# Altium footprint library PcbLib.PcbLib: 142 footprints (part 3 of 9)
Each footprint in its own frame and in the unit in brackets; x right, y up, seen from the top. Pads: shape width x height; smd on the part's side, far side on the other; paste and mask are expansions set on the pad; w line width, h text height; cw(c..) or ccw(c..) is an arc to the next point about the centre after c.
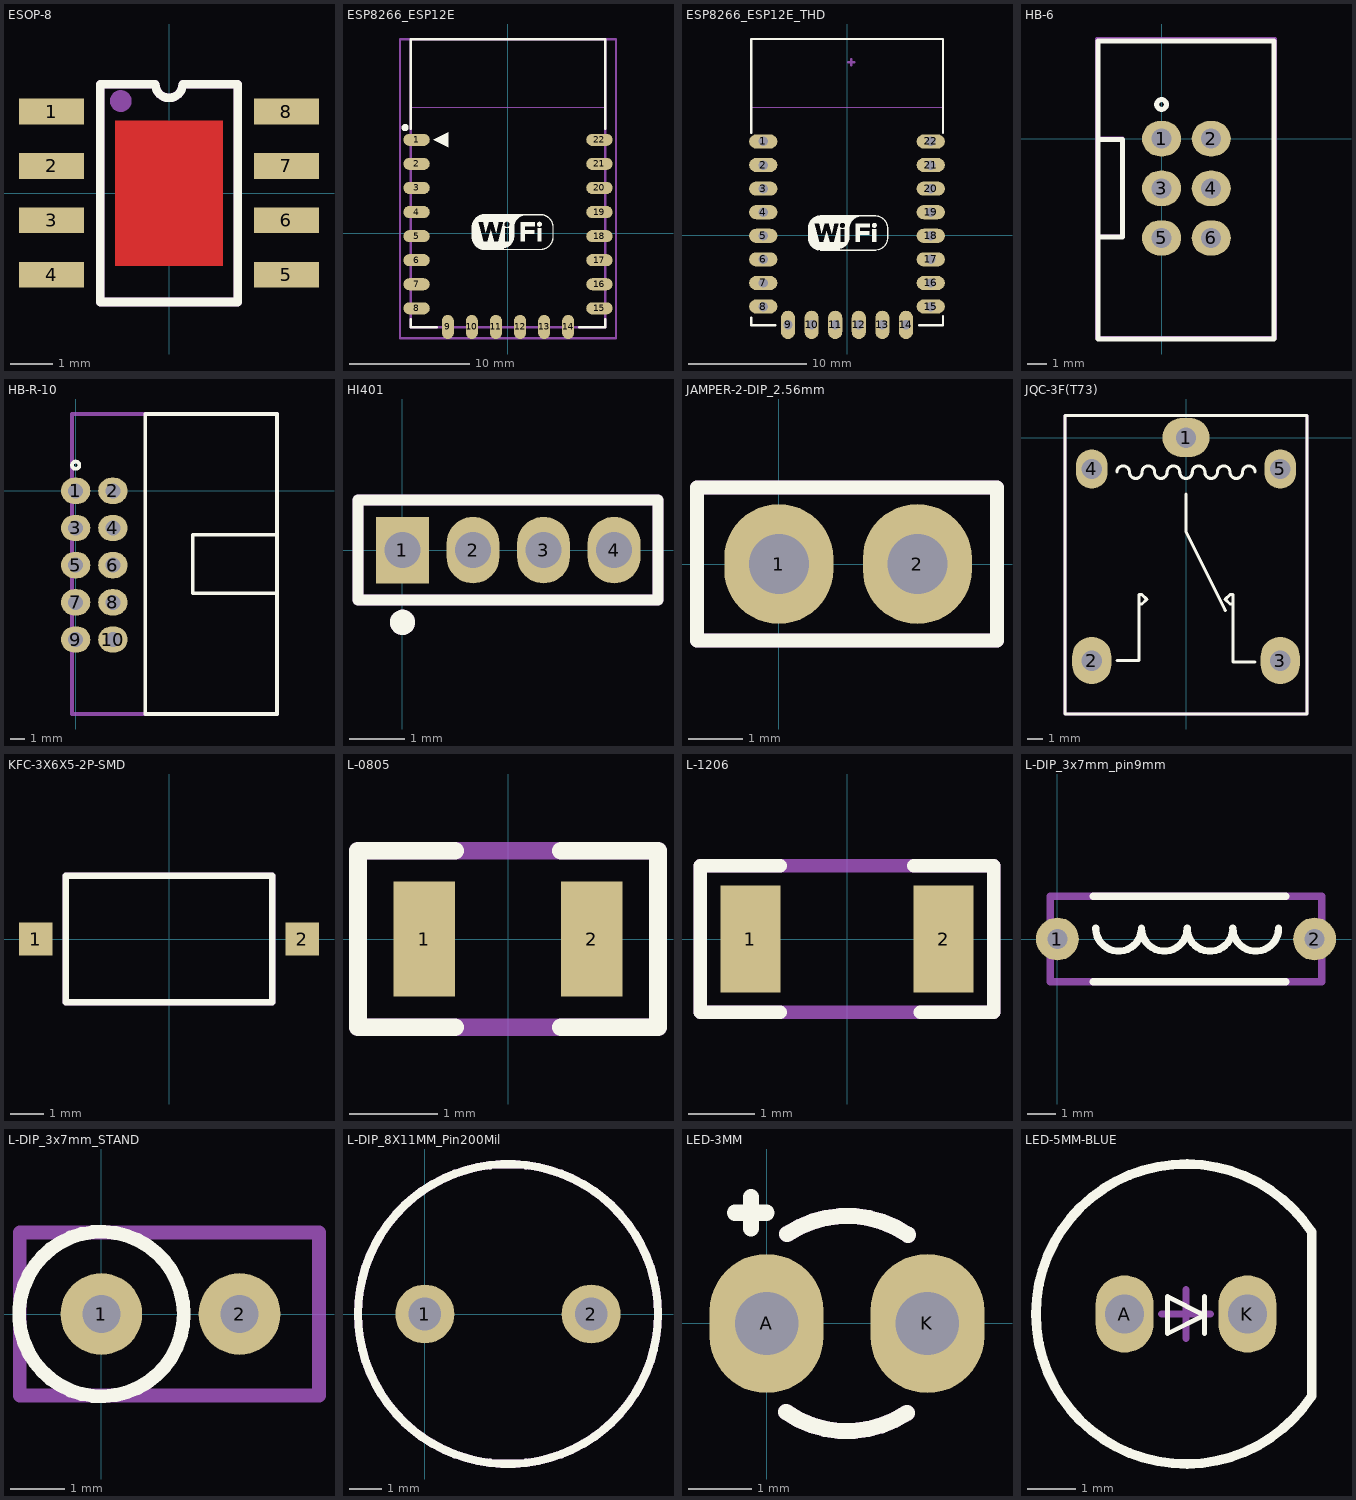
[diagram p2: the footprints below, top view; thin cyan lines are the x and y axes]

## ESOP-8 [mm]
pads (8):
  rect 1.52x0.6 smd: 1(-2.74,1.905) 2(-2.74,0.635) 3(-2.74,-0.635) 4(-2.74,-1.905) 5(2.74,-1.905) 6(2.74,-0.635) 7(2.74,0.635) 8(2.74,1.905)
Top Layer:
  rectangle: -1.256,-1.701 1.256,1.701
Top Overlay:
  lines w0.2: -1.6,-2.54 1.6,-2.54 1.6,2.54 0.318,2.54 cw(c0,2.54) -0.318,2.54 -1.6,2.54 -1.6,-2.54
Top Paste:
  rectangle: -1.256,-1.701 1.256,1.701
Top Solder:
  rectangle: -1.4,-1.85 1.4,1.85
Mechanical 29:
  circle w0.254: c-1.125,2.15 r0.127
  lines w0.2: -1.6,-2.54 1.6,-2.54 1.6,2.54 0.318,2.54 cw(c0,2.542) -0.317,2.54 -1.6,2.54 -1.6,-2.54
  text ".Designator" at 0.238,-1.121 h1
3D body "SOP8.step": height 1.75, standoff 0, extent -3.1,-2.5 3.1,2.5

## ESP8266_ESP12E [mm] "ESP-12 Wi-Fi Module"
height 3.2
pads (22):
  oval 2.2x1 smd: 1(-7.6,7.75) 2(-7.6,5.75) 3(-7.6,3.75) 4(-7.6,1.75) 5(-7.6,-0.25) 6(-7.6,-2.25) 7(-7.6,-4.25) 8(-7.6,-6.25) 15(7.6,-6.25) 16(7.6,-4.25) 17(7.6,-2.25) 18(7.6,-0.25) 19(7.6,1.75) 20(7.6,3.75) 21(7.6,5.75) 22(7.6,7.75)
  oval 1x2 smd: 9(-5,-7.8) 10(-3,-7.8) 11(-1,-7.8) 12(1,-7.8) 13(3,-7.8) 14(5,-7.8)
Top Overlay:
  drawing of 13 lines, arcs and shapes, not listed
Mechanical 29:
  lines w0.2: -8.975,-8.75 8.975,-8.75 8.975,16.121 -8.975,16.121 -8.975,-8.75
  text ".Designator" at -2.086,2.057 h1
Mechanical 13:
  lines w0.051: -8.127,10.477 8.129,10.477 8.129,16.132 -8.127,16.132 -8.127,10.477
  lines w0.2: -8.084,-7.818 -8.084,16.121 8.084,16.121 8.084,-7.818 -8.084,-7.818
3D body "ESP_12_E.STEP": height 2.75, standoff 0.04, extent -7.999,-7.741 8.001,16.259

## ESP8266_ESP12E_THD [mm] "ESP8266 ESP-12-E YHD"
pads (22):
  oval 2.4x1.2 hole 0.8: 1(-7.1,7.95) 2(-7.1,5.95) 3(-7.1,3.95) 4(-7.1,1.95) 5(-7.1,-0.05) 6(-7.1,-2.05) 7(-7.1,-4.05) 8(-7.1,-6.05) 15(7.1,-6.05) 16(7.1,-4.05) 17(7.1,-2.05) 18(7.1,-0.05) 19(7.1,1.95) 20(7.1,3.95) 21(7.1,5.95) 22(7.1,7.95)
  oval 1.2x2.4 hole 0.8: 9(-5,-7.6) 10(-3,-7.6) 11(-1,-7.6) 12(1,-7.6) 13(3,-7.6) 14(5,-7.6)
Top Overlay:
  drawing of 11 lines, arcs and shapes, not listed
Mechanical 13:
  lines w0.051: -8.063,10.87 8.193,10.87
Mechanical 15:
  lines w0.2: 0.114,14.679 0.622,14.679 ; 0.368,14.425 0.368,14.933
3D body "User Library-ESP_12_E.STEP": height -0.34, standoff -2.55, extent -8.001,-7.493 7.999,16.507

## HB-6 [mm]
pads (6):
  oval 2x1.8 hole 1.02: 1(0,0) 2(2.54,0) 3(0,-2.54) 4(2.54,-2.54) 5(0,-5.08) 6(2.54,-5.08)
Top Overlay:
  circle w0.254: c0,1.75 r0.25
  lines w0.254: -3.25,-10.25 5.75,-10.25 5.75,5 -3.25,5 -3.25,-10.25 ; -3.25,-5.04 -2,-5.04 -2,-0.04 -3.25,-0.04 -3.25,-5.04
Mechanical 29:
  lines w0.2: -3.25,-5 -2,-5 -2,0 -3.25,0 ; -3.3,-10.2 -3.3,5.1 5.8,5.1 5.8,-10.2 -3.3,-10.2
  text ".Designator" at 1.467,-4.7 h1
3D body "User Library-BH-06 (IDC-06MS).STEP": height 9, standoff -3, extent -3.291,-10.15 5.809,5.07

## HB-R-10 [mm]
pads (10):
  oval 2x1.8 hole 1.02: 1(0,0) 2(2.54,0) 3(0,-2.54) 4(2.54,-2.54) 5(0,-5.08) 6(2.54,-5.08) 7(0,-7.62) 8(2.54,-7.62) 9(0,-10.16) 10(2.54,-10.16)
Top Overlay:
  circle w0.254: c0,1.75 r0.25
  lines w0.254: 13.75,-7 8,-7 8,-3 13.75,-3 ; 4.75,-15.25 4.75,5.25 13.75,5.25 13.75,-15.25 4.75,-15.25
Mechanical 29:
  lines w0.254: -0.25,-15.25 -0.25,5.25 13.75,5.25 13.75,-15.25 -0.25,-15.25
  text ".Designator" at 8.967,-8.8 h1
3D body "User Library-DS1013-10R (IDC-10R CONNFLY).step": height 9, standoff -2.9, extent -0.32,-15.33 13.7,5.17

## HI401 [mm]
pads (4):
  rect 0.95x1.2 hole 0.65: 1(0,0)
  oval 0.95x1.2 hole 0.65: 2(1.27,0) 3(2.54,0) 4(3.81,0)
Top Overlay:
  circle w0.254: c0,-1.3 r0.1
  lines w0.2: -0.8,-0.9 -0.8,0.9 4.6,0.9 4.6,-0.9 -0.8,-0.9
Mechanical 29:
  circle w0.254: c0,-1.3 r0.1
  lines w0.2: -0.8,-0.9 -0.8,0.9 4.6,0.9 4.6,-0.9 -0.8,-0.9
  text ".Designator" at 0.6,-0.467 h1
3D body "Part1-n.STEP": height 9.8, standoff -7.66, extent -0.762,-0.763 4.578,0.787

## JAMPER-2-DIP_2.56mm [mm]
pads (2):
  oval 2x2.2 hole 1.1 mask+0.102: 1(0,0) 2(2.54,0)
Top Overlay:
  lines w0.254: -1.5,-1.4 -1.5,-0.7 -1.5,0.7 -1.5,1.4 4,1.4 4,-1.4 -1.5,-1.4
Mechanical 29:
  lines w0.254: -1.5,-1.4 -1.5,-0.7 -1.5,0.7 -1.5,1.4 4,1.4 4,-1.4 -1.5,-1.4
  text ".Designator" at 0.1,-0.467 h1
3D body "Jumper2.step": height 8.7, standoff -2.9, extent -1.33,-1.27 3.87,1.27

## JQC-3F(T73) [mm]
pads (5):
  oval 3x2.5 hole 1.3 paste-2539.97 mask+0.04: 1(0,0)
  oval 2.5x3 hole 1.3 paste-2539.97 mask+0.04: 2(-6,-14.2) 3(6,-14.2)
  oval 2x2.5 hole 1.3 paste-2539.97 mask+0.04: 4(-6,-2) 5(6,-2)
Top Overlay:
  lines w0.2: -4.4,-14.2 -3,-14.2 -3,-10 -2.8,-10 -2.5,-10.3 -2.8,-10.6 -3,-10.6 ; -4.4,-2.2 cw(c-4,-2.2) -3.6,-2.2 ccw(c-3.2,-2.2) -2.8,-2.2 cw(c-2.4,-2.2) -2,-2.2 ccw(c-1.6,-2.2) -1.2,-2.2 cw(c-0.8,-2.2) -0.4,-2.2 ccw(c0,-2.2) 0.4,-2.2 cw(c0.8,-2.2) 1.2,-2.2 ccw(c1.6,-2.2) 2,-2.2 cw(c2.4,-2.2) 2.8,-2.2 ccw(c3.2,-2.2) 3.6,-2.2 cw(c4,-2.2) 4.4,-2.2 ; 0,-3.6 0,-6 2.5,-11 ; 3,-10.6 2.8,-10.6 2.5,-10.3 2.8,-10 3,-10 3,-12 3,-14.3 4.4,-14.3 ; -7.7,-17.6 7.7,-17.6 7.7,1.4 -7.7,1.4 -7.7,-17.6
Mechanical 29:
  lines w0.2: -7.7,-17.6 7.7,-17.6 7.7,1.4 -7.7,1.4 -7.7,-17.6
  text ".Designator" at -2.8,-8.467 h1
3D body "Relay - JQC-3F(T73) - 5V.stp": height 14.94, standoff -3.61, extent -7.544,-17.447 7.544,1.247

## KFC-3X6X5-2P-SMD [mm]
pads (2):
  rect 1x1 smd: 1(-4,0) 2(4,0)
Top Overlay:
  lines w0.2: -3.1,-1.9 -3.1,1.9 3.1,1.9 3.1,-1.9 -3.1,-1.9
Mechanical 29:
  lines w0.2: -3.1,-1.9 -3.1,1.9 3.1,1.9 3.1,-1.9 -3.1,-1.9
  text ".Designator" at -0.8,-0.467 h1
3D body "btn.STEP": height 5, standoff 0, extent -4.5,-1.775 4.5,1.775

## L-0805 [mm]
pads (2):
  rect 0.7x1.3 smd: 1(-0.95,0) 2(0.95,0)
Top Overlay:
  lines w0.2: -0.6,-1 -1.7,-1 -1.7,1 -0.6,1 ; 0.6,-1 1.7,-1 1.7,1 0.6,1
Mechanical 29:
  lines w0.2: -1.7,-1 -1.7,1 1.7,1 1.7,-1 -1.7,-1
  text ".Designator" at -1.05,-0.467 h1
3D body "User Library-ind_0805.step": height 0.95, standoff 0, extent -1.1,-0.6 0.9,0.6

## L-1206 [mm]
pads (2):
  rect 0.9x1.6 smd: 1(-1.45,0) 2(1.45,0)
Top Overlay:
  lines w0.2: -1,-1.1 -2.2,-1.1 -2.2,1.1 -1,1.1 ; 1,1.1 2.2,1.1 2.2,-1.1 1.1,-1.1
Mechanical 29:
  lines w0.2: -2.2,-1.1 -2.2,1.1 2.2,1.1 2.2,-1.1 -2.2,-1.1
  text ".Designator" at -1.05,-0.217 h1
3D body "74479157.stp": height 1.1, standoff 0, extent -1.6,-0.8 1.6,0.8

## L-DIP_3x7mm_pin9mm [mm]
pads (2):
  round 1.5 hole 0.7 mask+0.102: 1(0,0) 2(9,0)
Top Overlay:
  lines w0.254: 1.25,-1.5 8,-1.5 ; 1.25,1.5 8,1.5 ; 1.341,0.375 ccw(c2.141,0.375) 2.941,0.375 ccw(c3.741,0.375) 4.541,0.375 ccw(c5.341,0.375) 6.141,0.375 ccw(c6.941,0.375) 7.741,0.375
Mechanical 29:
  lines w0.254: -0.25,-1.5 -0.25,1.5 9.25,1.5 9.25,-1.5 -0.25,-1.5
  text ".Designator" at 2.45,-0.217 h1
3D body "Part1.STEP": height 3.5, standoff -0.91, extent -0.25,-1.5 9.25,1.5

## L-DIP_3x7mm_STAND [mm]
pads (2):
  round 1.5 hole 0.7 mask+0.102: 1(0,0) 2(2.54,0)
Top Overlay:
  circle w0.254: c0,0 r1.513
Mechanical 29:
  lines w0.254: -1.5,-1.5 4,-1.5 4,1.5 -1.5,1.5 -1.5,-1.5
  text ".Designator" at 0.5,-0.267 h1
3D body "Part1.STEP": height 8.09, standoff -0.9, extent -1.499,-1.499 2.803,1.499

## L-DIP_8X11MM_Pin200Mil [mm]
pads (2):
  round 1.8 hole 1: 1(0,0) 2(5.08,0)
Top Overlay:
  circle w0.254: c2.54,0 r4.579
Mechanical 29:
  circle w0.254: c2.54,0 r4.579
  text ".Designator" at 3.023,-0.816 h1
3D body "Part2.STEP": height 11.3, standoff -4.5, extent -1.96,-4.5 7.04,4.5

## LED-3MM [mm]
pads (2):
  oval 1.8x2.2 hole 1: A(0,0)
  oval 1.8x2.2 hole 1 mask+0.102: K(2.54,0)
Top Overlay:
  lines w0.254: -0.5,1.75 0,1.75 ; -0.25,1.5 -0.25,2 ; 0.308,-1.402 ccw(c1.27,0) 2.216,-1.413 ; 0.324,1.413 cw(c1.27,0) 2.232,1.402
Mechanical 29:
  lines w0.254: 0.308,-1.402 ccw(c1.27,0) 2.216,-1.413 ; 0.324,1.413 cw(c1.27,0) 2.232,1.402
  text ".Designator" at -0.55,-0.392 h1
3D body "LED 3mm RED.STEP": height 9.5, standoff -21, extent -0.33,-1.6 2.87,1.6

## LED-5MM-BLUE [mm]
pads (2):
  oval 1.2x1.6 hole 0.8: A(51.993,89.487) K(54.533,89.487)
Top Overlay:
  lines w0.1: 53.644,89.084 53.644,89.846 ; 52.882,89.084 53.644,89.465 52.882,89.846 52.882,89.084
  lines w0.2: 55.863,87.787 55.863,91.187 ; 55.863,87.799 cw(c53.263,89.487) 55.863,91.175
Mechanical 15:
  lines w0.15: 52.763,89.487 53.763,89.487 ; 53.263,88.987 53.263,89.987
3D body "User Library-LEDd5B.STEP": height 12.31, standoff -2.49, extent 50.273,86.507 55.693,92.527